# Altium integrated library WCAP-ATG5_rev15a.intlib: 201 symbols (part 2 of 3)
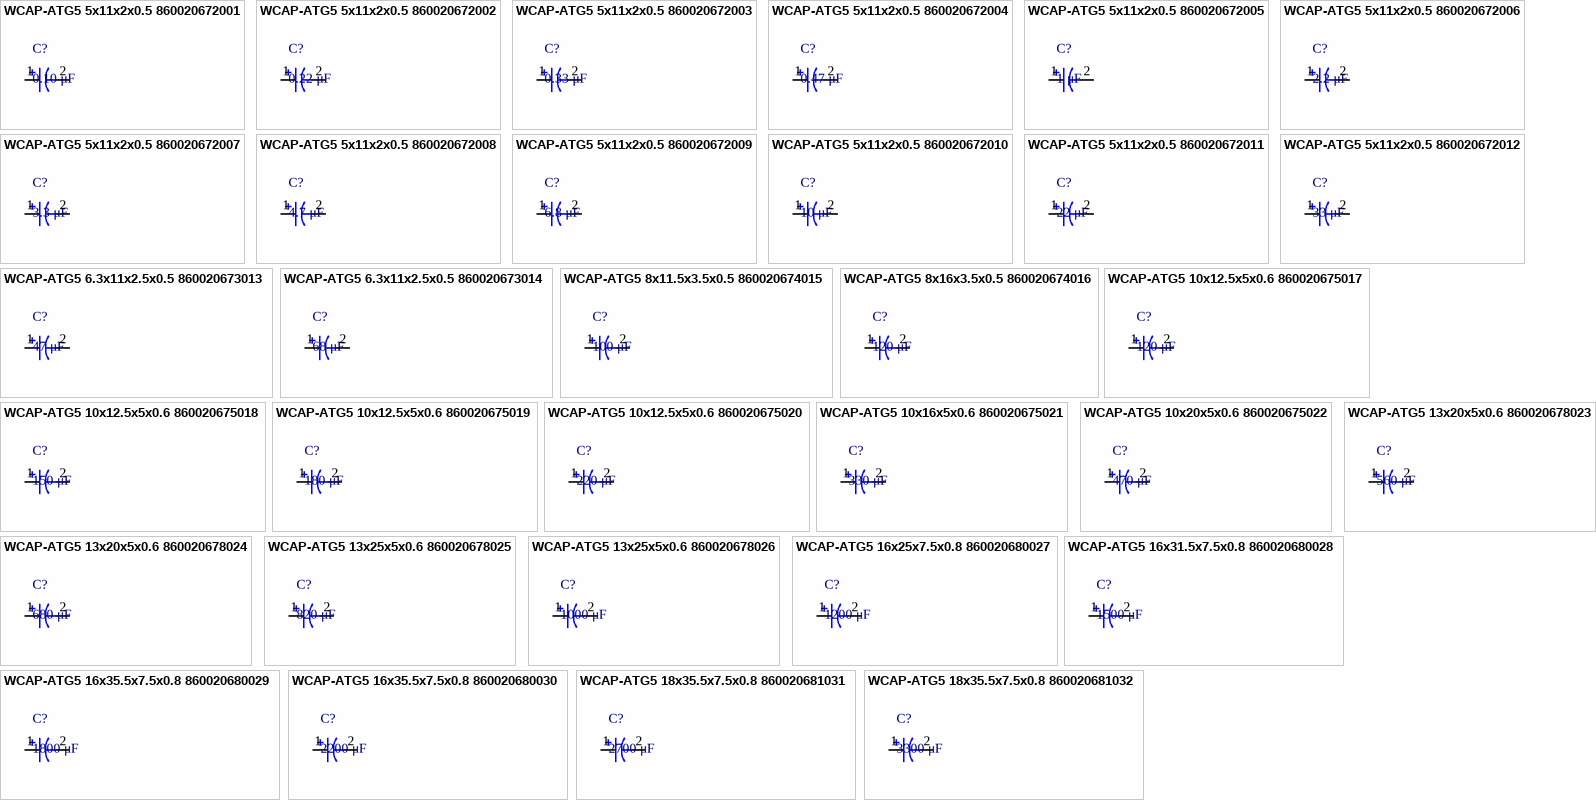
[diagram p7: symbols WCAP-ATG5 5x11x2x0.5 860020672001 to WCAP-ATG5 18x35.5x7.5x0.8 860020681032]

## WCAP-ATG5 5x11x2x0.5 860020672002
designator C?, comment 0.22 μF
WCAP-ATG5 Aluminum Electrolytic Capacitors , 0,22 μF; + / - 20%; 50 V , 5 x 11; Manufacturer: Wurth Elektronik; partNo: 860020672002; E-mail: libraries@we-online.com; Characteristics: Aluminum Electrolytic Capacitor; Recommended soldering: Wave; Operating temperature:–40 °C to +105 °C for UR < 400 V; –25 °C to +105 °C for UR ≥ 400 V; General purpose product series with max. temperature of +105 °C; Load life: 2000 h @ +105 °C; ComponentLink1Description: Manufacturer; ComponentLink1URL: http://www.we-online.com; ComponentLink2Description: Datasheet; ComponentLink2URL: http://katalog.we-online.de/pbs/datasheet/860020672002.pdf; Created by: Karrer Zheng; Created Date: 6/8/2015; Capacitance: 0.22 μF; Application: Medium and high voltage type range from 160V-450V used as primary side input filter in power supply; Low voltage type used as energy storage or low frequency filtering in circuit, applied to general switching power supply, AC-DC converter, adapter, charger, TV, VCR, DC motor circuit filter, digital audio, digital cameras, digital video cameras, satellite receiver etc.
footprint WCAP-ATG5 5x11x2x0.5
pins: 1, 2

## WCAP-ATG5 5x11x2x0.5 860020672003
designator C?, comment 0.33 μF
WCAP-ATG5 Aluminum Electrolytic Capacitors , 0,33 μF; + / - 20%; 50 V , 5 x 11; Manufacturer: Wurth Elektronik; partNo: 860020672003; E-mail: libraries@we-online.com; Characteristics: Aluminum Electrolytic Capacitor; Recommended soldering: Wave; Operating temperature:–40 °C to +105 °C for UR < 400 V; –25 °C to +105 °C for UR ≥ 400 V; General purpose product series with max. temperature of +105 °C; Load life: 2000 h @ +105 °C; ComponentLink1Description: Manufacturer; ComponentLink1URL: http://www.we-online.com; ComponentLink2Description: Datasheet; ComponentLink2URL: http://katalog.we-online.de/pbs/datasheet/860020672003.pdf; Created by: Karrer Zheng; Created Date: 6/8/2015; Capacitance: 0.33 μF; Application: Medium and high voltage type range from 160V-450V used as primary side input filter in power supply; Low voltage type used as energy storage or low frequency filtering in circuit, applied to general switching power supply, AC-DC converter, adapter, charger, TV, VCR, DC motor circuit filter, digital audio, digital cameras, digital video cameras, satellite receiver etc.
footprint WCAP-ATG5 5x11x2x0.5
pins: 1, 2

## WCAP-ATG5 5x11x2x0.5 860020672004
designator C?, comment 0.47 μF
WCAP-ATG5 Aluminum Electrolytic Capacitors , 0,47 μF; + / - 20%; 50 V , 5 x 11; Manufacturer: Wurth Elektronik; partNo: 860020672004; E-mail: libraries@we-online.com; Characteristics: Aluminum Electrolytic Capacitor; Recommended soldering: Wave; Operating temperature:–40 °C to +105 °C for UR < 400 V; –25 °C to +105 °C for UR ≥ 400 V; General purpose product series with max. temperature of +105 °C; Load life: 2000 h @ +105 °C; ComponentLink1Description: Manufacturer; ComponentLink1URL: http://www.we-online.com; ComponentLink2Description: Datasheet; ComponentLink2URL: http://katalog.we-online.de/pbs/datasheet/860020672004.pdf; Created by: Karrer Zheng; Created Date: 6/8/2015; Capacitance: 0.47 μF; Application: Medium and high voltage type range from 160V-450V used as primary side input filter in power supply; Low voltage type used as energy storage or low frequency filtering in circuit, applied to general switching power supply, AC-DC converter, adapter, charger, TV, VCR, DC motor circuit filter, digital audio, digital cameras, digital video cameras, satellite receiver etc.
footprint WCAP-ATG5 5x11x2x0.5
pins: 1, 2

## WCAP-ATG5 5x11x2x0.5 860020672005
designator C?, comment 1 μF
WCAP-ATG5 Aluminum Electrolytic Capacitors , 1 μF; + / - 20%; 50 V , 5 x 11; Manufacturer: Wurth Elektronik; partNo: 860020672005; E-mail: libraries@we-online.com; Characteristics: Aluminum Electrolytic Capacitor; Recommended soldering: Wave; Operating temperature:–40 °C to +105 °C for UR < 400 V; –25 °C to +105 °C for UR ≥ 400 V; General purpose product series with max. temperature of +105 °C; Load life: 2000 h @ +105 °C; ComponentLink1Description: Manufacturer; ComponentLink1URL: http://www.we-online.com; ComponentLink2Description: Datasheet; ComponentLink2URL: http://katalog.we-online.de/pbs/datasheet/860020672005.pdf; Created by: Karrer Zheng; Created Date: 6/8/2015; Capacitance: 1 μF; Application: Medium and high voltage type range from 160V-450V used as primary side input filter in power supply; Low voltage type used as energy storage or low frequency filtering in circuit, applied to general switching power supply, AC-DC converter, adapter, charger, TV, VCR, DC motor circuit filter, digital audio, digital cameras, digital video cameras, satellite receiver etc.
footprint WCAP-ATG5 5x11x2x0.5
pins: 1, 2

## WCAP-ATG5 5x11x2x0.5 860020672006
designator C?, comment 2.2 μF
WCAP-ATG5 Aluminum Electrolytic Capacitors , 2,2 μF; + / - 20%; 50 V , 5 x 11; Manufacturer: Wurth Elektronik; partNo: 860020672006; E-mail: libraries@we-online.com; Characteristics: Aluminum Electrolytic Capacitor; Recommended soldering: Wave; Operating temperature:–40 °C to +105 °C for UR < 400 V; –25 °C to +105 °C for UR ≥ 400 V; General purpose product series with max. temperature of +105 °C; Load life: 2000 h @ +105 °C; ComponentLink1Description: Manufacturer; ComponentLink1URL: http://www.we-online.com; ComponentLink2Description: Datasheet; ComponentLink2URL: http://katalog.we-online.de/pbs/datasheet/860020672006.pdf; Created by: Karrer Zheng; Created Date: 6/8/2015; Capacitance: 2.2 μF; Application: Medium and high voltage type range from 160V-450V used as primary side input filter in power supply; Low voltage type used as energy storage or low frequency filtering in circuit, applied to general switching power supply, AC-DC converter, adapter, charger, TV, VCR, DC motor circuit filter, digital audio, digital cameras, digital video cameras, satellite receiver etc.
footprint WCAP-ATG5 5x11x2x0.5
pins: 1, 2

## WCAP-ATG5 5x11x2x0.5 860020672007
designator C?, comment 3.3 μF
WCAP-ATG5 Aluminum Electrolytic Capacitors , 3,3 μF; + / - 20%; 50 V , 5 x 11; Manufacturer: Wurth Elektronik; partNo: 860020672007; E-mail: libraries@we-online.com; Characteristics: Aluminum Electrolytic Capacitor; Recommended soldering: Wave; Operating temperature:–40 °C to +105 °C for UR < 400 V; –25 °C to +105 °C for UR ≥ 400 V; General purpose product series with max. temperature of +105 °C; Load life: 2000 h @ +105 °C; ComponentLink1Description: Manufacturer; ComponentLink1URL: http://www.we-online.com; ComponentLink2Description: Datasheet; ComponentLink2URL: http://katalog.we-online.de/pbs/datasheet/860020672007.pdf; Created by: Karrer Zheng; Created Date: 6/8/2015; Capacitance: 3.3 μF; Application: Medium and high voltage type range from 160V-450V used as primary side input filter in power supply; Low voltage type used as energy storage or low frequency filtering in circuit, applied to general switching power supply, AC-DC converter, adapter, charger, TV, VCR, DC motor circuit filter, digital audio, digital cameras, digital video cameras, satellite receiver etc.
footprint WCAP-ATG5 5x11x2x0.5
pins: 1, 2

## WCAP-ATG5 5x11x2x0.5 860020672008
designator C?, comment 4.7 μF
WCAP-ATG5 Aluminum Electrolytic Capacitors , 4,7 μF; + / - 20%; 50 V , 5 x 11; Manufacturer: Wurth Elektronik; partNo: 860020672008; E-mail: libraries@we-online.com; Characteristics: Aluminum Electrolytic Capacitor; Recommended soldering: Wave; Operating temperature:–40 °C to +105 °C for UR < 400 V; –25 °C to +105 °C for UR ≥ 400 V; General purpose product series with max. temperature of +105 °C; Load life: 2000 h @ +105 °C; ComponentLink1Description: Manufacturer; ComponentLink1URL: http://www.we-online.com; ComponentLink2Description: Datasheet; ComponentLink2URL: http://katalog.we-online.de/pbs/datasheet/860020672008.pdf; Created by: Karrer Zheng; Created Date: 6/8/2015; Capacitance: 4.7 μF; Application: Medium and high voltage type range from 160V-450V used as primary side input filter in power supply; Low voltage type used as energy storage or low frequency filtering in circuit, applied to general switching power supply, AC-DC converter, adapter, charger, TV, VCR, DC motor circuit filter, digital audio, digital cameras, digital video cameras, satellite receiver etc.
footprint WCAP-ATG5 5x11x2x0.5
pins: 1, 2

## WCAP-ATG5 5x11x2x0.5 860020672009
designator C?, comment 6.8 μF
WCAP-ATG5 Aluminum Electrolytic Capacitors , 6,8 μF; + / - 20%; 50 V , 5 x 11; Manufacturer: Wurth Elektronik; partNo: 860020672009; E-mail: libraries@we-online.com; Characteristics: Aluminum Electrolytic Capacitor; Recommended soldering: Wave; Operating temperature:–40 °C to +105 °C for UR < 400 V; –25 °C to +105 °C for UR ≥ 400 V; General purpose product series with max. temperature of +105 °C; Load life: 2000 h @ +105 °C; ComponentLink1Description: Manufacturer; ComponentLink1URL: http://www.we-online.com; ComponentLink2Description: Datasheet; ComponentLink2URL: http://katalog.we-online.de/pbs/datasheet/860020672009.pdf; Created by: Karrer Zheng; Created Date: 6/8/2015; Capacitance: 6.8 μF; Application: Medium and high voltage type range from 160V-450V used as primary side input filter in power supply; Low voltage type used as energy storage or low frequency filtering in circuit, applied to general switching power supply, AC-DC converter, adapter, charger, TV, VCR, DC motor circuit filter, digital audio, digital cameras, digital video cameras, satellite receiver etc.
footprint WCAP-ATG5 5x11x2x0.5
pins: 1, 2

## WCAP-ATG5 5x11x2x0.5 860020672010
designator C?, comment 10 μF
WCAP-ATG5 Aluminum Electrolytic Capacitors , 10 μF; + / - 20%; 50 V , 5 x 11; Manufacturer: Wurth Elektronik; partNo: 860020672010; E-mail: libraries@we-online.com; Characteristics: Aluminum Electrolytic Capacitor; Recommended soldering: Wave; Operating temperature:–40 °C to +105 °C for UR < 400 V; –25 °C to +105 °C for UR ≥ 400 V; General purpose product series with max. temperature of +105 °C; Load life: 2000 h @ +105 °C; ComponentLink1Description: Manufacturer; ComponentLink1URL: http://www.we-online.com; ComponentLink2Description: Datasheet; ComponentLink2URL: http://katalog.we-online.de/pbs/datasheet/860020672010.pdf; Created by: Karrer Zheng; Created Date: 6/8/2015; Capacitance: 10 μF; Application: Medium and high voltage type range from 160V-450V used as primary side input filter in power supply; Low voltage type used as energy storage or low frequency filtering in circuit, applied to general switching power supply, AC-DC converter, adapter, charger, TV, VCR, DC motor circuit filter, digital audio, digital cameras, digital video cameras, satellite receiver etc.
footprint WCAP-ATG5 5x11x2x0.5
pins: 1, 2

## WCAP-ATG5 5x11x2x0.5 860020672011
designator C?, comment 22 μF
WCAP-ATG5 Aluminum Electrolytic Capacitors , 22 μF; + / - 20%; 50 V , 5 x 11; Manufacturer: Wurth Elektronik; partNo: 860020672011; E-mail: libraries@we-online.com; Characteristics: Aluminum Electrolytic Capacitor; Recommended soldering: Wave; Operating temperature:–40 °C to +105 °C for UR < 400 V; –25 °C to +105 °C for UR ≥ 400 V; General purpose product series with max. temperature of +105 °C; Load life: 2000 h @ +105 °C; ComponentLink1Description: Manufacturer; ComponentLink1URL: http://www.we-online.com; ComponentLink2Description: Datasheet; ComponentLink2URL: http://katalog.we-online.de/pbs/datasheet/860020672011.pdf; Created by: Karrer Zheng; Created Date: 6/8/2015; Capacitance: 22 μF; Application: Medium and high voltage type range from 160V-450V used as primary side input filter in power supply; Low voltage type used as energy storage or low frequency filtering in circuit, applied to general switching power supply, AC-DC converter, adapter, charger, TV, VCR, DC motor circuit filter, digital audio, digital cameras, digital video cameras, satellite receiver etc.
footprint WCAP-ATG5 5x11x2x0.5
pins: 1, 2

## WCAP-ATG5 5x11x2x0.5 860020672012
designator C?, comment 33 μF
WCAP-ATG5 Aluminum Electrolytic Capacitors , 33 μF; + / - 20%; 50 V , 5 x 11; Manufacturer: Wurth Elektronik; partNo: 860020672012; E-mail: libraries@we-online.com; Characteristics: Aluminum Electrolytic Capacitor; Recommended soldering: Wave; Operating temperature:–40 °C to +105 °C for UR < 400 V; –25 °C to +105 °C for UR ≥ 400 V; General purpose product series with max. temperature of +105 °C; Load life: 2000 h @ +105 °C; ComponentLink1Description: Manufacturer; ComponentLink1URL: http://www.we-online.com; ComponentLink2Description: Datasheet; ComponentLink2URL: http://katalog.we-online.de/pbs/datasheet/860020672012.pdf; Created by: Karrer Zheng; Created Date: 6/8/2015; Capacitance: 33 μF; Application: Medium and high voltage type range from 160V-450V used as primary side input filter in power supply; Low voltage type used as energy storage or low frequency filtering in circuit, applied to general switching power supply, AC-DC converter, adapter, charger, TV, VCR, DC motor circuit filter, digital audio, digital cameras, digital video cameras, satellite receiver etc.
footprint WCAP-ATG5 5x11x2x0.5
pins: 1, 2

## WCAP-ATG5 6.3x11x2.5x0.5 860020673013
designator C?, comment 47 μF
WCAP-ATG5 Aluminum Electrolytic Capacitors , 47 μF; + / - 20%; 50 V , 6,3 x 11; Manufacturer: Wurth Elektronik; partNo: 860020673013; E-mail: libraries@we-online.com; Characteristics: Aluminum Electrolytic Capacitor; Recommended soldering: Wave; Operating temperature:–40 °C to +105 °C for UR < 400 V; –25 °C to +105 °C for UR ≥ 400 V; General purpose product series with max. temperature of +105 °C; Load life: 2000 h @ +105 °C; ComponentLink1Description: Manufacturer; ComponentLink1URL: http://www.we-online.com; ComponentLink2Description: Datasheet; ComponentLink2URL: http://katalog.we-online.de/pbs/datasheet/860020673013.pdf; Created by: Karrer Zheng; Created Date: 6/8/2015; Capacitance: 47 μF; Application: Medium and high voltage type range from 160V-450V used as primary side input filter in power supply; Low voltage type used as energy storage or low frequency filtering in circuit, applied to general switching power supply, AC-DC converter, adapter, charger, TV, VCR, DC motor circuit filter, digital audio, digital cameras, digital video cameras, satellite receiver etc.
footprint WCAP-ATG5 6.3x11x2.5x0.5
pins: 1, 2

## WCAP-ATG5 6.3x11x2.5x0.5 860020673014
designator C?, comment 68 μF
WCAP-ATG5 Aluminum Electrolytic Capacitors , 68 μF; + / - 20%; 50 V , 6,3 x 11; Manufacturer: Wurth Elektronik; partNo: 860020673014; E-mail: libraries@we-online.com; Characteristics: Aluminum Electrolytic Capacitor; Recommended soldering: Wave; Operating temperature:–40 °C to +105 °C for UR < 400 V; –25 °C to +105 °C for UR ≥ 400 V; General purpose product series with max. temperature of +105 °C; Load life: 2000 h @ +105 °C; ComponentLink1Description: Manufacturer; ComponentLink1URL: http://www.we-online.com; ComponentLink2Description: Datasheet; ComponentLink2URL: http://katalog.we-online.de/pbs/datasheet/860020673014.pdf; Created by: Karrer Zheng; Created Date: 6/8/2015; Capacitance: 68 μF; Application: Medium and high voltage type range from 160V-450V used as primary side input filter in power supply; Low voltage type used as energy storage or low frequency filtering in circuit, applied to general switching power supply, AC-DC converter, adapter, charger, TV, VCR, DC motor circuit filter, digital audio, digital cameras, digital video cameras, satellite receiver etc.
footprint WCAP-ATG5 6.3x11x2.5x0.5
pins: 1, 2

## WCAP-ATG5 8x11.5x3.5x0.5 860020674015
designator C?, comment 100 μF
WCAP-ATG5 Aluminum Electrolytic Capacitors , 100 μF; + / - 20%; 50 V , 8 x 11,5; Manufacturer: Wurth Elektronik; partNo: 860020674015; E-mail: libraries@we-online.com; Characteristics: Aluminum Electrolytic Capacitor; Recommended soldering: Wave; Operating temperature:–40 °C to +105 °C for UR < 400 V; –25 °C to +105 °C for UR ≥ 400 V; General purpose product series with max. temperature of +105 °C; Load life: 2000 h @ +105 °C; ComponentLink1Description: Manufacturer; ComponentLink1URL: http://www.we-online.com; ComponentLink2Description: Datasheet; ComponentLink2URL: http://katalog.we-online.de/pbs/datasheet/860020674015.pdf; Created by: Karrer Zheng; Created Date: 6/8/2015; Capacitance: 100 μF; Application: Medium and high voltage type range from 160V-450V used as primary side input filter in power supply; Low voltage type used as energy storage or low frequency filtering in circuit, applied to general switching power supply, AC-DC converter, adapter, charger, TV, VCR, DC motor circuit filter, digital audio, digital cameras, digital video cameras, satellite receiver etc.
footprint WCAP-ATG5 8x11.5x3.5x0.5
pins: 1, 2

## WCAP-ATG5 8x16x3.5x0.5 860020674016
designator C?, comment 120 μF
WCAP-ATG5 Aluminum Electrolytic Capacitors , 120 μF; + / - 20%; 50 V , 8 x 16; Manufacturer: Wurth Elektronik; partNo: 860020674016; E-mail: libraries@we-online.com; Characteristics: Aluminum Electrolytic Capacitor; Recommended soldering: Wave; Operating temperature:–40 °C to +105 °C for UR < 400 V; –25 °C to +105 °C for UR ≥ 400 V; General purpose product series with max. temperature of +105 °C; Load life: 2000 h @ +105 °C; ComponentLink1Description: Manufacturer; ComponentLink1URL: http://www.we-online.com; ComponentLink2Description: Datasheet; ComponentLink2URL: http://katalog.we-online.de/pbs/datasheet/860020674016.pdf; Created by: Karrer Zheng; Created Date: 6/8/2015; Capacitance: 120 μF; Application: Medium and high voltage type range from 160V-450V used as primary side input filter in power supply; Low voltage type used as energy storage or low frequency filtering in circuit, applied to general switching power supply, AC-DC converter, adapter, charger, TV, VCR, DC motor circuit filter, digital audio, digital cameras, digital video cameras, satellite receiver etc.
footprint WCAP-ATG5 8x16x3.5x0.5
pins: 1, 2

## WCAP-ATG5 10x12.5x5x0.6 860020675017
designator C?, comment 120 μF
WCAP-ATG5 Aluminum Electrolytic Capacitors , 120 μF; + / - 20%; 50 V , 10 x 12,5; Manufacturer: Wurth Elektronik; partNo: 860020675017; E-mail: libraries@we-online.com; Characteristics: Aluminum Electrolytic Capacitor; Recommended soldering: Wave; Operating temperature:–40 °C to +105 °C for UR < 400 V; –25 °C to +105 °C for UR ≥ 400 V; General purpose product series with max. temperature of +105 °C; Load life: 2000 h @ +105 °C; ComponentLink1Description: Manufacturer; ComponentLink1URL: http://www.we-online.com; ComponentLink2Description: Datasheet; ComponentLink2URL: http://katalog.we-online.de/pbs/datasheet/860020675017.pdf; Created by: Karrer Zheng; Created Date: 6/8/2015; Capacitance: 120 μF; Application: Medium and high voltage type range from 160V-450V used as primary side input filter in power supply; Low voltage type used as energy storage or low frequency filtering in circuit, applied to general switching power supply, AC-DC converter, adapter, charger, TV, VCR, DC motor circuit filter, digital audio, digital cameras, digital video cameras, satellite receiver etc.
footprint WCAP-ATG5 10x12.5x5x0.6
pins: 1, 2

## WCAP-ATG5 10x12.5x5x0.6 860020675018
designator C?, comment 150 μF
WCAP-ATG5 Aluminum Electrolytic Capacitors , 150 μF; + / - 20%; 50 V , 10 x 12,5; Manufacturer: Wurth Elektronik; partNo: 860020675018; E-mail: libraries@we-online.com; Characteristics: Aluminum Electrolytic Capacitor; Recommended soldering: Wave; Operating temperature:–40 °C to +105 °C for UR < 400 V; –25 °C to +105 °C for UR ≥ 400 V; General purpose product series with max. temperature of +105 °C; Load life: 2000 h @ +105 °C; ComponentLink1Description: Manufacturer; ComponentLink1URL: http://www.we-online.com; ComponentLink2Description: Datasheet; ComponentLink2URL: http://katalog.we-online.de/pbs/datasheet/860020675018.pdf; Created by: Karrer Zheng; Created Date: 6/8/2015; Capacitance: 150 μF; Application: Medium and high voltage type range from 160V-450V used as primary side input filter in power supply; Low voltage type used as energy storage or low frequency filtering in circuit, applied to general switching power supply, AC-DC converter, adapter, charger, TV, VCR, DC motor circuit filter, digital audio, digital cameras, digital video cameras, satellite receiver etc.
footprint WCAP-ATG5 10x12.5x5x0.6
pins: 1, 2

## WCAP-ATG5 10x12.5x5x0.6 860020675019
designator C?, comment 180 μF
WCAP-ATG5 Aluminum Electrolytic Capacitors , 180 μF; + / - 20%; 50 V , 10 x 12,5; Manufacturer: Wurth Elektronik; partNo: 860020675019; E-mail: libraries@we-online.com; Characteristics: Aluminum Electrolytic Capacitor; Recommended soldering: Wave; Operating temperature:–40 °C to +105 °C for UR < 400 V; –25 °C to +105 °C for UR ≥ 400 V; General purpose product series with max. temperature of +105 °C; Load life: 2000 h @ +105 °C; ComponentLink1Description: Manufacturer; ComponentLink1URL: http://www.we-online.com; ComponentLink2Description: Datasheet; ComponentLink2URL: http://katalog.we-online.de/pbs/datasheet/860020675019.pdf; Created by: Karrer Zheng; Created Date: 6/8/2015; Capacitance: 180 μF; Application: Medium and high voltage type range from 160V-450V used as primary side input filter in power supply; Low voltage type used as energy storage or low frequency filtering in circuit, applied to general switching power supply, AC-DC converter, adapter, charger, TV, VCR, DC motor circuit filter, digital audio, digital cameras, digital video cameras, satellite receiver etc.
footprint WCAP-ATG5 10x12.5x5x0.6
pins: 1, 2

## WCAP-ATG5 10x12.5x5x0.6 860020675020
designator C?, comment 220 μF
WCAP-ATG5 Aluminum Electrolytic Capacitors , 220 μF; + / - 20%; 50 V , 10 x 12,5; Manufacturer: Wurth Elektronik; partNo: 860020675020; E-mail: libraries@we-online.com; Characteristics: Aluminum Electrolytic Capacitor; Recommended soldering: Wave; Operating temperature:–40 °C to +105 °C for UR < 400 V; –25 °C to +105 °C for UR ≥ 400 V; General purpose product series with max. temperature of +105 °C; Load life: 2000 h @ +105 °C; ComponentLink1Description: Manufacturer; ComponentLink1URL: http://www.we-online.com; ComponentLink2Description: Datasheet; ComponentLink2URL: http://katalog.we-online.de/pbs/datasheet/860020675020.pdf; Created by: Karrer Zheng; Created Date: 6/8/2015; Capacitance: 220 μF; Application: Medium and high voltage type range from 160V-450V used as primary side input filter in power supply; Low voltage type used as energy storage or low frequency filtering in circuit, applied to general switching power supply, AC-DC converter, adapter, charger, TV, VCR, DC motor circuit filter, digital audio, digital cameras, digital video cameras, satellite receiver etc.
footprint WCAP-ATG5 10x12.5x5x0.6
pins: 1, 2

## WCAP-ATG5 10x16x5x0.6 860020675021
designator C?, comment 330 μF
WCAP-ATG5 Aluminum Electrolytic Capacitors , 330 μF; + / - 20%; 50 V , 10 x 16; Manufacturer: Wurth Elektronik; partNo: 860020675021; E-mail: libraries@we-online.com; Characteristics: Aluminum Electrolytic Capacitor; Recommended soldering: Wave; Operating temperature:–40 °C to +105 °C for UR < 400 V; –25 °C to +105 °C for UR ≥ 400 V; General purpose product series with max. temperature of +105 °C; Load life: 2000 h @ +105 °C; ComponentLink1Description: Manufacturer; ComponentLink1URL: http://www.we-online.com; ComponentLink2Description: Datasheet; ComponentLink2URL: http://katalog.we-online.de/pbs/datasheet/860020675021.pdf; Created by: Karrer Zheng; Created Date: 6/8/2015; Capacitance: 330 μF; Application: Medium and high voltage type range from 160V-450V used as primary side input filter in power supply; Low voltage type used as energy storage or low frequency filtering in circuit, applied to general switching power supply, AC-DC converter, adapter, charger, TV, VCR, DC motor circuit filter, digital audio, digital cameras, digital video cameras, satellite receiver etc.
footprint WCAP-ATG5 10x16x5x0.6
pins: 1, 2

## WCAP-ATG5 10x20x5x0.6 860020675022
designator C?, comment 470 μF
WCAP-ATG5 Aluminum Electrolytic Capacitors , 470 μF; + / - 20%; 50 V , 10 x 20; Manufacturer: Wurth Elektronik; partNo: 860020675022; E-mail: libraries@we-online.com; Characteristics: Aluminum Electrolytic Capacitor; Recommended soldering: Wave; Operating temperature:–40 °C to +105 °C for UR < 400 V; –25 °C to +105 °C for UR ≥ 400 V; General purpose product series with max. temperature of +105 °C; Load life: 2000 h @ +105 °C; ComponentLink1Description: Manufacturer; ComponentLink1URL: http://www.we-online.com; ComponentLink2Description: Datasheet; ComponentLink2URL: http://katalog.we-online.de/pbs/datasheet/860020675022.pdf; Created by: Karrer Zheng; Created Date: 6/8/2015; Capacitance: 470 μF; Application: Medium and high voltage type range from 160V-450V used as primary side input filter in power supply; Low voltage type used as energy storage or low frequency filtering in circuit, applied to general switching power supply, AC-DC converter, adapter, charger, TV, VCR, DC motor circuit filter, digital audio, digital cameras, digital video cameras, satellite receiver etc.
footprint WCAP-ATG5 10x20x5x0.6
pins: 1, 2

## WCAP-ATG5 13x20x5x0.6 860020678023
designator C?, comment 560 μF
WCAP-ATG5 Aluminum Electrolytic Capacitors , 560 μF; + / - 20%; 50 V , 13 x 20; Manufacturer: Wurth Elektronik; partNo: 860020678023; E-mail: libraries@we-online.com; Characteristics: Aluminum Electrolytic Capacitor; Recommended soldering: Wave; Operating temperature:–40 °C to +105 °C for UR < 400 V; –25 °C to +105 °C for UR ≥ 400 V; General purpose product series with max. temperature of +105 °C; Load life: 2000 h @ +105 °C; ComponentLink1Description: Manufacturer; ComponentLink1URL: http://www.we-online.com; ComponentLink2Description: Datasheet; ComponentLink2URL: http://katalog.we-online.de/pbs/datasheet/860020678023.pdf; Created by: Karrer Zheng; Created Date: 6/8/2015; Capacitance: 560 μF; Application: Medium and high voltage type range from 160V-450V used as primary side input filter in power supply; Low voltage type used as energy storage or low frequency filtering in circuit, applied to general switching power supply, AC-DC converter, adapter, charger, TV, VCR, DC motor circuit filter, digital audio, digital cameras, digital video cameras, satellite receiver etc.
footprint WCAP-ATG5 13x20x5x0.6
pins: 1, 2

## WCAP-ATG5 13x20x5x0.6 860020678024
designator C?, comment 680 μF
WCAP-ATG5 Aluminum Electrolytic Capacitors , 680 μF; + / - 20%; 50 V , 13 x 20; Manufacturer: Wurth Elektronik; partNo: 860020678024; E-mail: libraries@we-online.com; Characteristics: Aluminum Electrolytic Capacitor; Recommended soldering: Wave; Operating temperature:–40 °C to +105 °C for UR < 400 V; –25 °C to +105 °C for UR ≥ 400 V; General purpose product series with max. temperature of +105 °C; Load life: 2000 h @ +105 °C; ComponentLink1Description: Manufacturer; ComponentLink1URL: http://www.we-online.com; ComponentLink2Description: Datasheet; ComponentLink2URL: http://katalog.we-online.de/pbs/datasheet/860020678024.pdf; Created by: Karrer Zheng; Created Date: 6/8/2015; Capacitance: 680 μF; Application: Medium and high voltage type range from 160V-450V used as primary side input filter in power supply; Low voltage type used as energy storage or low frequency filtering in circuit, applied to general switching power supply, AC-DC converter, adapter, charger, TV, VCR, DC motor circuit filter, digital audio, digital cameras, digital video cameras, satellite receiver etc.
footprint WCAP-ATG5 13x20x5x0.6
pins: 1, 2

## WCAP-ATG5 13x25x5x0.6 860020678025
designator C?, comment 820 μF
WCAP-ATG5 Aluminum Electrolytic Capacitors , 820 μF; + / - 20%; 50 V , 13 x 25; Manufacturer: Wurth Elektronik; partNo: 860020678025; E-mail: libraries@we-online.com; Characteristics: Aluminum Electrolytic Capacitor; Recommended soldering: Wave; Operating temperature:–40 °C to +105 °C for UR < 400 V; –25 °C to +105 °C for UR ≥ 400 V; General purpose product series with max. temperature of +105 °C; Load life: 2000 h @ +105 °C; ComponentLink1Description: Manufacturer; ComponentLink1URL: http://www.we-online.com; ComponentLink2Description: Datasheet; ComponentLink2URL: http://katalog.we-online.de/pbs/datasheet/860020678025.pdf; Created by: Karrer Zheng; Created Date: 6/8/2015; Capacitance: 820 μF; Application: Medium and high voltage type range from 160V-450V used as primary side input filter in power supply; Low voltage type used as energy storage or low frequency filtering in circuit, applied to general switching power supply, AC-DC converter, adapter, charger, TV, VCR, DC motor circuit filter, digital audio, digital cameras, digital video cameras, satellite receiver etc.
footprint WCAP-ATG5 13x25x5x0.6
pins: 1, 2

## WCAP-ATG5 13x25x5x0.6 860020678026
designator C?, comment 1000 μF
WCAP-ATG5 Aluminum Electrolytic Capacitors , 1000 μF; + / - 20%; 50 V , 13 x 25; Manufacturer: Wurth Elektronik; partNo: 860020678026; E-mail: libraries@we-online.com; Characteristics: Aluminum Electrolytic Capacitor; Recommended soldering: Wave; Operating temperature:–40 °C to +105 °C for UR < 400 V; –25 °C to +105 °C for UR ≥ 400 V; General purpose product series with max. temperature of +105 °C; Load life: 2000 h @ +105 °C; ComponentLink1Description: Manufacturer; ComponentLink1URL: http://www.we-online.com; ComponentLink2Description: Datasheet; ComponentLink2URL: http://katalog.we-online.de/pbs/datasheet/860020678026.pdf; Created by: Karrer Zheng; Created Date: 6/8/2015; Capacitance: 1000 μF; Application: Medium and high voltage type range from 160V-450V used as primary side input filter in power supply; Low voltage type used as energy storage or low frequency filtering in circuit, applied to general switching power supply, AC-DC converter, adapter, charger, TV, VCR, DC motor circuit filter, digital audio, digital cameras, digital video cameras, satellite receiver etc.
footprint WCAP-ATG5 13x25x5x0.6
pins: 1, 2

## WCAP-ATG5 16x25x7.5x0.8 860020680027
designator C?, comment 1200 μF
WCAP-ATG5 Aluminum Electrolytic Capacitors , 1200 μF; + / - 20%; 50 V , 16 x 25; Manufacturer: Wurth Elektronik; partNo: 860020680027; E-mail: libraries@we-online.com; Characteristics: Aluminum Electrolytic Capacitor; Recommended soldering: Wave; Operating temperature:–40 °C to +105 °C for UR < 400 V; –25 °C to +105 °C for UR ≥ 400 V; General purpose product series with max. temperature of +105 °C; Load life: 2000 h @ +105 °C; ComponentLink1Description: Manufacturer; ComponentLink1URL: http://www.we-online.com; ComponentLink2Description: Datasheet; ComponentLink2URL: http://katalog.we-online.de/pbs/datasheet/860020680027.pdf; Created by: Karrer Zheng; Created Date: 6/8/2015; Capacitance: 1200 μF; Application: Medium and high voltage type range from 160V-450V used as primary side input filter in power supply; Low voltage type used as energy storage or low frequency filtering in circuit, applied to general switching power supply, AC-DC converter, adapter, charger, TV, VCR, DC motor circuit filter, digital audio, digital cameras, digital video cameras, satellite receiver etc.
footprint WCAP-ATG5 16x25x7.5x0.8
pins: 1, 2

## WCAP-ATG5 16x31.5x7.5x0.8 860020680028
designator C?, comment 1500 μF
WCAP-ATG5 Aluminum Electrolytic Capacitors , 1500 μF; + / - 20%; 50 V , 16 x 31,5; Manufacturer: Wurth Elektronik; partNo: 860020680028; E-mail: libraries@we-online.com; Characteristics: Aluminum Electrolytic Capacitor; Recommended soldering: Wave; Operating temperature:–40 °C to +105 °C for UR < 400 V; –25 °C to +105 °C for UR ≥ 400 V; General purpose product series with max. temperature of +105 °C; Load life: 2000 h @ +105 °C; ComponentLink1Description: Manufacturer; ComponentLink1URL: http://www.we-online.com; ComponentLink2Description: Datasheet; ComponentLink2URL: http://katalog.we-online.de/pbs/datasheet/860020680028.pdf; Created by: Karrer Zheng; Created Date: 6/8/2015; Capacitance: 1500 μF; Application: Medium and high voltage type range from 160V-450V used as primary side input filter in power supply; Low voltage type used as energy storage or low frequency filtering in circuit, applied to general switching power supply, AC-DC converter, adapter, charger, TV, VCR, DC motor circuit filter, digital audio, digital cameras, digital video cameras, satellite receiver etc.
footprint WCAP-ATG5 16x31.5x7.5x0.8
pins: 1, 2

## WCAP-ATG5 16x35.5x7.5x0.8 860020680029
designator C?, comment 1800 μF
WCAP-ATG5 Aluminum Electrolytic Capacitors , 1800 μF; + / - 20%; 50 V , 16 x 35,5; Manufacturer: Wurth Elektronik; partNo: 860020680029; E-mail: libraries@we-online.com; Characteristics: Aluminum Electrolytic Capacitor; Recommended soldering: Wave; Operating temperature:–40 °C to +105 °C for UR < 400 V; –25 °C to +105 °C for UR ≥ 400 V; General purpose product series with max. temperature of +105 °C; Load life: 2000 h @ +105 °C; ComponentLink1Description: Manufacturer; ComponentLink1URL: http://www.we-online.com; ComponentLink2Description: Datasheet; ComponentLink2URL: http://katalog.we-online.de/pbs/datasheet/860020680029.pdf; Created by: Karrer Zheng; Created Date: 6/8/2015; Capacitance: 1800 μF; Application: Medium and high voltage type range from 160V-450V used as primary side input filter in power supply; Low voltage type used as energy storage or low frequency filtering in circuit, applied to general switching power supply, AC-DC converter, adapter, charger, TV, VCR, DC motor circuit filter, digital audio, digital cameras, digital video cameras, satellite receiver etc.
footprint WCAP-ATG5 16x35.5x7.5x0.8
pins: 1, 2

## WCAP-ATG5 16x35.5x7.5x0.8 860020680030
designator C?, comment 2200 μF
WCAP-ATG5 Aluminum Electrolytic Capacitors , 2200 μF; + / - 20%; 50 V , 16 x 35,5; Manufacturer: Wurth Elektronik; partNo: 860020680030; E-mail: libraries@we-online.com; Characteristics: Aluminum Electrolytic Capacitor; Recommended soldering: Wave; Operating temperature:–40 °C to +105 °C for UR < 400 V; –25 °C to +105 °C for UR ≥ 400 V; General purpose product series with max. temperature of +105 °C; Load life: 2000 h @ +105 °C; ComponentLink1Description: Manufacturer; ComponentLink1URL: http://www.we-online.com; ComponentLink2Description: Datasheet; ComponentLink2URL: http://katalog.we-online.de/pbs/datasheet/860020680030.pdf; Created by: Karrer Zheng; Created Date: 6/8/2015; Capacitance: 2200 μF; Application: Medium and high voltage type range from 160V-450V used as primary side input filter in power supply; Low voltage type used as energy storage or low frequency filtering in circuit, applied to general switching power supply, AC-DC converter, adapter, charger, TV, VCR, DC motor circuit filter, digital audio, digital cameras, digital video cameras, satellite receiver etc.
footprint WCAP-ATG5 16x35.5x7.5x0.8
pins: 1, 2

## WCAP-ATG5 18x35.5x7.5x0.8 860020681031
designator C?, comment 2700 μF
WCAP-ATG5 Aluminum Electrolytic Capacitors , 2700 μF; + / - 20%; 50 V , 18 x 35,5; Manufacturer: Wurth Elektronik; partNo: 860020681031; E-mail: libraries@we-online.com; Characteristics: Aluminum Electrolytic Capacitor; Recommended soldering: Wave; Operating temperature:–40 °C to +105 °C for UR < 400 V; –25 °C to +105 °C for UR ≥ 400 V; General purpose product series with max. temperature of +105 °C; Load life: 2000 h @ +105 °C; ComponentLink1Description: Manufacturer; ComponentLink1URL: http://www.we-online.com; ComponentLink2Description: Datasheet; ComponentLink2URL: http://katalog.we-online.de/pbs/datasheet/860020681031.pdf; Created by: Karrer Zheng; Created Date: 6/8/2015; Capacitance: 2700 μF; Application: Medium and high voltage type range from 160V-450V used as primary side input filter in power supply; Low voltage type used as energy storage or low frequency filtering in circuit, applied to general switching power supply, AC-DC converter, adapter, charger, TV, VCR, DC motor circuit filter, digital audio, digital cameras, digital video cameras, satellite receiver etc.
footprint WCAP-ATG5 18x35.5x7.5x0.8
pins: 1, 2

## WCAP-ATG5 18x35.5x7.5x0.8 860020681032
designator C?, comment 3300 μF
WCAP-ATG5 Aluminum Electrolytic Capacitors , 3300 μF; + / - 20%; 50 V , 18 x 35,5; Manufacturer: Wurth Elektronik; partNo: 860020681032; E-mail: libraries@we-online.com; Characteristics: Aluminum Electrolytic Capacitor; Recommended soldering: Wave; Operating temperature:–40 °C to +105 °C for UR < 400 V; –25 °C to +105 °C for UR ≥ 400 V; General purpose product series with max. temperature of +105 °C; Load life: 2000 h @ +105 °C; ComponentLink1Description: Manufacturer; ComponentLink1URL: http://www.we-online.com; ComponentLink2Description: Datasheet; ComponentLink2URL: http://katalog.we-online.de/pbs/datasheet/860020681032.pdf; Created by: Karrer Zheng; Created Date: 6/8/2015; Capacitance: 3300 μF; Application: Medium and high voltage type range from 160V-450V used as primary side input filter in power supply; Low voltage type used as energy storage or low frequency filtering in circuit, applied to general switching power supply, AC-DC converter, adapter, charger, TV, VCR, DC motor circuit filter, digital audio, digital cameras, digital video cameras, satellite receiver etc.
footprint WCAP-ATG5 18x35.5x7.5x0.8
pins: 1, 2


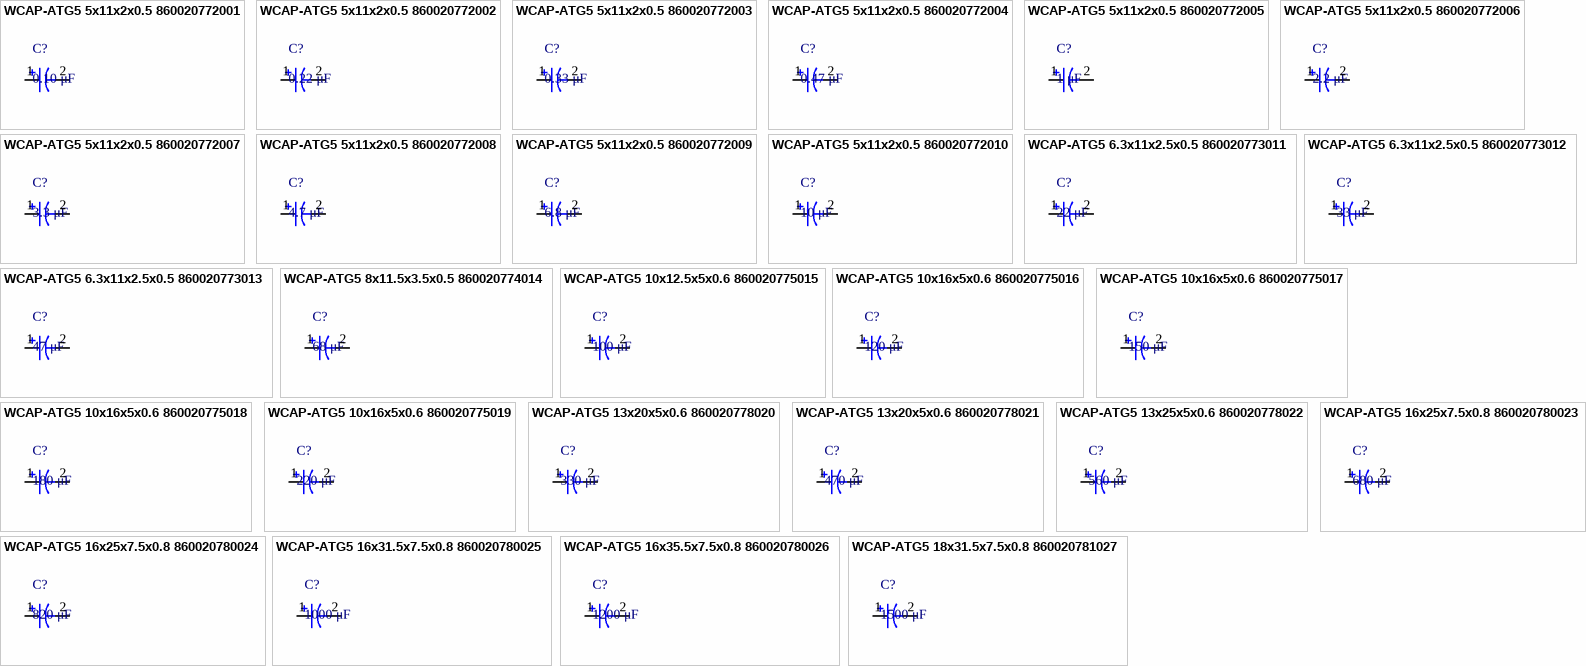
[diagram p4: symbols WCAP-ATG5 5x11x2x0.5 860020772001 to WCAP-ATG5 18x31.5x7.5x0.8 860020781027]

## WCAP-ATG5 5x11x2x0.5 860020772001
designator C?, comment 0.10 μF
WCAP-ATG5 Aluminum Electrolytic Capacitors , 0,10 μF; + / - 20%; 63 V , 5 x 11; Manufacturer: Wurth Elektronik; partNo: 860020772001; E-mail: libraries@we-online.com; Characteristics: Aluminum Electrolytic Capacitor; Recommended soldering: Wave; Operating temperature:–40 °C to +105 °C for UR < 400 V; –25 °C to +105 °C for UR ≥ 400 V; General purpose product series with max. temperature of +105 °C; Load life: 2000 h @ +105 °C; ComponentLink1Description: Manufacturer; ComponentLink1URL: http://www.we-online.com; ComponentLink2Description: Datasheet; ComponentLink2URL: http://katalog.we-online.de/pbs/datasheet/860020772001.pdf; Created by: Karrer Zheng; Created Date: 6/8/2015; Capacitance: 0.10 μF; Application: Medium and high voltage type range from 160V-450V used as primary side input filter in power supply; Low voltage type used as energy storage or low frequency filtering in circuit, applied to general switching power supply, AC-DC converter, adapter, charger, TV, VCR, DC motor circuit filter, digital audio, digital cameras, digital video cameras, satellite receiver etc.
footprint WCAP-ATG5 5x11x2x0.5
pins: 1, 2

## WCAP-ATG5 5x11x2x0.5 860020772002
designator C?, comment 0.22 μF
WCAP-ATG5 Aluminum Electrolytic Capacitors , 0,22 μF; + / - 20%; 63 V , 5 x 11; Manufacturer: Wurth Elektronik; partNo: 860020772002; E-mail: libraries@we-online.com; Characteristics: Aluminum Electrolytic Capacitor; Recommended soldering: Wave; Operating temperature:–40 °C to +105 °C for UR < 400 V; –25 °C to +105 °C for UR ≥ 400 V; General purpose product series with max. temperature of +105 °C; Load life: 2000 h @ +105 °C; ComponentLink1Description: Manufacturer; ComponentLink1URL: http://www.we-online.com; ComponentLink2Description: Datasheet; ComponentLink2URL: http://katalog.we-online.de/pbs/datasheet/860020772002.pdf; Created by: Karrer Zheng; Created Date: 6/8/2015; Capacitance: 0.22 μF; Application: Medium and high voltage type range from 160V-450V used as primary side input filter in power supply; Low voltage type used as energy storage or low frequency filtering in circuit, applied to general switching power supply, AC-DC converter, adapter, charger, TV, VCR, DC motor circuit filter, digital audio, digital cameras, digital video cameras, satellite receiver etc.
footprint WCAP-ATG5 5x11x2x0.5
pins: 1, 2

## WCAP-ATG5 5x11x2x0.5 860020772003
designator C?, comment 0.33 μF
WCAP-ATG5 Aluminum Electrolytic Capacitors , 0,33 μF; + / - 20%; 63 V , 5 x 11; Manufacturer: Wurth Elektronik; partNo: 860020772003; E-mail: libraries@we-online.com; Characteristics: Aluminum Electrolytic Capacitor; Recommended soldering: Wave; Operating temperature:–40 °C to +105 °C for UR < 400 V; –25 °C to +105 °C for UR ≥ 400 V; General purpose product series with max. temperature of +105 °C; Load life: 2000 h @ +105 °C; ComponentLink1Description: Manufacturer; ComponentLink1URL: http://www.we-online.com; ComponentLink2Description: Datasheet; ComponentLink2URL: http://katalog.we-online.de/pbs/datasheet/860020772003.pdf; Created by: Karrer Zheng; Created Date: 6/8/2015; Capacitance: 0.33 μF; Application: Medium and high voltage type range from 160V-450V used as primary side input filter in power supply; Low voltage type used as energy storage or low frequency filtering in circuit, applied to general switching power supply, AC-DC converter, adapter, charger, TV, VCR, DC motor circuit filter, digital audio, digital cameras, digital video cameras, satellite receiver etc.
footprint WCAP-ATG5 5x11x2x0.5
pins: 1, 2

## WCAP-ATG5 5x11x2x0.5 860020772004
designator C?, comment 0.47 μF
WCAP-ATG5 Aluminum Electrolytic Capacitors , 0,47 μF; + / - 20%; 63 V , 5 x 11; Manufacturer: Wurth Elektronik; partNo: 860020772004; E-mail: libraries@we-online.com; Characteristics: Aluminum Electrolytic Capacitor; Recommended soldering: Wave; Operating temperature:–40 °C to +105 °C for UR < 400 V; –25 °C to +105 °C for UR ≥ 400 V; General purpose product series with max. temperature of +105 °C; Load life: 2000 h @ +105 °C; ComponentLink1Description: Manufacturer; ComponentLink1URL: http://www.we-online.com; ComponentLink2Description: Datasheet; ComponentLink2URL: http://katalog.we-online.de/pbs/datasheet/860020772004.pdf; Created by: Karrer Zheng; Created Date: 6/8/2015; Capacitance: 0.47 μF; Application: Medium and high voltage type range from 160V-450V used as primary side input filter in power supply; Low voltage type used as energy storage or low frequency filtering in circuit, applied to general switching power supply, AC-DC converter, adapter, charger, TV, VCR, DC motor circuit filter, digital audio, digital cameras, digital video cameras, satellite receiver etc.
footprint WCAP-ATG5 5x11x2x0.5
pins: 1, 2

## WCAP-ATG5 5x11x2x0.5 860020772005
designator C?, comment 1 μF
WCAP-ATG5 Aluminum Electrolytic Capacitors , 1 μF; + / - 20%; 63 V , 5 x 11; Manufacturer: Wurth Elektronik; partNo: 860020772005; E-mail: libraries@we-online.com; Characteristics: Aluminum Electrolytic Capacitor; Recommended soldering: Wave; Operating temperature:–40 °C to +105 °C for UR < 400 V; –25 °C to +105 °C for UR ≥ 400 V; General purpose product series with max. temperature of +105 °C; Load life: 2000 h @ +105 °C; ComponentLink1Description: Manufacturer; ComponentLink1URL: http://www.we-online.com; ComponentLink2Description: Datasheet; ComponentLink2URL: http://katalog.we-online.de/pbs/datasheet/860020772005.pdf; Created by: Karrer Zheng; Created Date: 6/8/2015; Capacitance: 1 μF; Application: Medium and high voltage type range from 160V-450V used as primary side input filter in power supply; Low voltage type used as energy storage or low frequency filtering in circuit, applied to general switching power supply, AC-DC converter, adapter, charger, TV, VCR, DC motor circuit filter, digital audio, digital cameras, digital video cameras, satellite receiver etc.
footprint WCAP-ATG5 5x11x2x0.5
pins: 1, 2

## WCAP-ATG5 5x11x2x0.5 860020772006
designator C?, comment 2.2 μF
WCAP-ATG5 Aluminum Electrolytic Capacitors , 2,2 μF; + / - 20%; 63 V , 5 x 11; Manufacturer: Wurth Elektronik; partNo: 860020772006; E-mail: libraries@we-online.com; Characteristics: Aluminum Electrolytic Capacitor; Recommended soldering: Wave; Operating temperature:–40 °C to +105 °C for UR < 400 V; –25 °C to +105 °C for UR ≥ 400 V; General purpose product series with max. temperature of +105 °C; Load life: 2000 h @ +105 °C; ComponentLink1Description: Manufacturer; ComponentLink1URL: http://www.we-online.com; ComponentLink2Description: Datasheet; ComponentLink2URL: http://katalog.we-online.de/pbs/datasheet/860020772006.pdf; Created by: Karrer Zheng; Created Date: 6/8/2015; Capacitance: 2.2 μF; Application: Medium and high voltage type range from 160V-450V used as primary side input filter in power supply; Low voltage type used as energy storage or low frequency filtering in circuit, applied to general switching power supply, AC-DC converter, adapter, charger, TV, VCR, DC motor circuit filter, digital audio, digital cameras, digital video cameras, satellite receiver etc.
footprint WCAP-ATG5 5x11x2x0.5
pins: 1, 2

## WCAP-ATG5 5x11x2x0.5 860020772007
designator C?, comment 3.3 μF
WCAP-ATG5 Aluminum Electrolytic Capacitors , 3,3 μF; + / - 20%; 63 V , 5 x 11; Manufacturer: Wurth Elektronik; partNo: 860020772007; E-mail: libraries@we-online.com; Characteristics: Aluminum Electrolytic Capacitor; Recommended soldering: Wave; Operating temperature:–40 °C to +105 °C for UR < 400 V; –25 °C to +105 °C for UR ≥ 400 V; General purpose product series with max. temperature of +105 °C; Load life: 2000 h @ +105 °C; ComponentLink1Description: Manufacturer; ComponentLink1URL: http://www.we-online.com; ComponentLink2Description: Datasheet; ComponentLink2URL: http://katalog.we-online.de/pbs/datasheet/860020772007.pdf; Created by: Karrer Zheng; Created Date: 6/8/2015; Capacitance: 3.3 μF; Application: Medium and high voltage type range from 160V-450V used as primary side input filter in power supply; Low voltage type used as energy storage or low frequency filtering in circuit, applied to general switching power supply, AC-DC converter, adapter, charger, TV, VCR, DC motor circuit filter, digital audio, digital cameras, digital video cameras, satellite receiver etc.
footprint WCAP-ATG5 5x11x2x0.5
pins: 1, 2

## WCAP-ATG5 5x11x2x0.5 860020772008
designator C?, comment 4.7 μF
WCAP-ATG5 Aluminum Electrolytic Capacitors , 4,7 μF; + / - 20%; 63 V , 5 x 11; Manufacturer: Wurth Elektronik; partNo: 860020772008; E-mail: libraries@we-online.com; Characteristics: Aluminum Electrolytic Capacitor; Recommended soldering: Wave; Operating temperature:–40 °C to +105 °C for UR < 400 V; –25 °C to +105 °C for UR ≥ 400 V; General purpose product series with max. temperature of +105 °C; Load life: 2000 h @ +105 °C; ComponentLink1Description: Manufacturer; ComponentLink1URL: http://www.we-online.com; ComponentLink2Description: Datasheet; ComponentLink2URL: http://katalog.we-online.de/pbs/datasheet/860020772008.pdf; Created by: Karrer Zheng; Created Date: 6/8/2015; Capacitance: 4.7 μF; Application: Medium and high voltage type range from 160V-450V used as primary side input filter in power supply; Low voltage type used as energy storage or low frequency filtering in circuit, applied to general switching power supply, AC-DC converter, adapter, charger, TV, VCR, DC motor circuit filter, digital audio, digital cameras, digital video cameras, satellite receiver etc.
footprint WCAP-ATG5 5x11x2x0.5
pins: 1, 2

## WCAP-ATG5 5x11x2x0.5 860020772009
designator C?, comment 6.8 μF
WCAP-ATG5 Aluminum Electrolytic Capacitors , 6,8 μF; + / - 20%; 63 V , 5 x 11; Manufacturer: Wurth Elektronik; partNo: 860020772009; E-mail: libraries@we-online.com; Characteristics: Aluminum Electrolytic Capacitor; Recommended soldering: Wave; Operating temperature:–40 °C to +105 °C for UR < 400 V; –25 °C to +105 °C for UR ≥ 400 V; General purpose product series with max. temperature of +105 °C; Load life: 2000 h @ +105 °C; ComponentLink1Description: Manufacturer; ComponentLink1URL: http://www.we-online.com; ComponentLink2Description: Datasheet; ComponentLink2URL: http://katalog.we-online.de/pbs/datasheet/860020772009.pdf; Created by: Karrer Zheng; Created Date: 6/8/2015; Capacitance: 6.8 μF; Application: Medium and high voltage type range from 160V-450V used as primary side input filter in power supply; Low voltage type used as energy storage or low frequency filtering in circuit, applied to general switching power supply, AC-DC converter, adapter, charger, TV, VCR, DC motor circuit filter, digital audio, digital cameras, digital video cameras, satellite receiver etc.
footprint WCAP-ATG5 5x11x2x0.5
pins: 1, 2

## WCAP-ATG5 5x11x2x0.5 860020772010
designator C?, comment 10 μF
WCAP-ATG5 Aluminum Electrolytic Capacitors , 10 μF; + / - 20%; 63 V , 5 x 11; Manufacturer: Wurth Elektronik; partNo: 860020772010; E-mail: libraries@we-online.com; Characteristics: Aluminum Electrolytic Capacitor; Recommended soldering: Wave; Operating temperature:–40 °C to +105 °C for UR < 400 V; –25 °C to +105 °C for UR ≥ 400 V; General purpose product series with max. temperature of +105 °C; Load life: 2000 h @ +105 °C; ComponentLink1Description: Manufacturer; ComponentLink1URL: http://www.we-online.com; ComponentLink2Description: Datasheet; ComponentLink2URL: http://katalog.we-online.de/pbs/datasheet/860020772010.pdf; Created by: Karrer Zheng; Created Date: 6/8/2015; Capacitance: 10 μF; Application: Medium and high voltage type range from 160V-450V used as primary side input filter in power supply; Low voltage type used as energy storage or low frequency filtering in circuit, applied to general switching power supply, AC-DC converter, adapter, charger, TV, VCR, DC motor circuit filter, digital audio, digital cameras, digital video cameras, satellite receiver etc.
footprint WCAP-ATG5 5x11x2x0.5
pins: 1, 2

## WCAP-ATG5 6.3x11x2.5x0.5 860020773011
designator C?, comment 22 μF
WCAP-ATG5 Aluminum Electrolytic Capacitors , 22 μF; + / - 20%; 63 V , 6,3 x 11; Manufacturer: Wurth Elektronik; partNo: 860020773011; E-mail: libraries@we-online.com; Characteristics: Aluminum Electrolytic Capacitor; Recommended soldering: Wave; Operating temperature:–40 °C to +105 °C for UR < 400 V; –25 °C to +105 °C for UR ≥ 400 V; General purpose product series with max. temperature of +105 °C; Load life: 2000 h @ +105 °C; ComponentLink1Description: Manufacturer; ComponentLink1URL: http://www.we-online.com; ComponentLink2Description: Datasheet; ComponentLink2URL: http://katalog.we-online.de/pbs/datasheet/860020773011.pdf; Created by: Karrer Zheng; Created Date: 6/8/2015; Capacitance: 22 μF; Application: Medium and high voltage type range from 160V-450V used as primary side input filter in power supply; Low voltage type used as energy storage or low frequency filtering in circuit, applied to general switching power supply, AC-DC converter, adapter, charger, TV, VCR, DC motor circuit filter, digital audio, digital cameras, digital video cameras, satellite receiver etc.
footprint WCAP-ATG5 6.3x11x2.5x0.5
pins: 1, 2

## WCAP-ATG5 6.3x11x2.5x0.5 860020773012
designator C?, comment 33 μF
WCAP-ATG5 Aluminum Electrolytic Capacitors , 33 μF; + / - 20%; 63 V , 6,3 x 11; Manufacturer: Wurth Elektronik; partNo: 860020773012; E-mail: libraries@we-online.com; Characteristics: Aluminum Electrolytic Capacitor; Recommended soldering: Wave; Operating temperature:–40 °C to +105 °C for UR < 400 V; –25 °C to +105 °C for UR ≥ 400 V; General purpose product series with max. temperature of +105 °C; Load life: 2000 h @ +105 °C; ComponentLink1Description: Manufacturer; ComponentLink1URL: http://www.we-online.com; ComponentLink2Description: Datasheet; ComponentLink2URL: http://katalog.we-online.de/pbs/datasheet/860020773012.pdf; Created by: Karrer Zheng; Created Date: 6/8/2015; Capacitance: 33 μF; Application: Medium and high voltage type range from 160V-450V used as primary side input filter in power supply; Low voltage type used as energy storage or low frequency filtering in circuit, applied to general switching power supply, AC-DC converter, adapter, charger, TV, VCR, DC motor circuit filter, digital audio, digital cameras, digital video cameras, satellite receiver etc.
footprint WCAP-ATG5 6.3x11x2.5x0.5
pins: 1, 2

## WCAP-ATG5 6.3x11x2.5x0.5 860020773013
designator C?, comment 47 μF
WCAP-ATG5 Aluminum Electrolytic Capacitors , 47 μF; + / - 20%; 63 V , 6,3 x 11; Manufacturer: Wurth Elektronik; partNo: 860020773013; E-mail: libraries@we-online.com; Characteristics: Aluminum Electrolytic Capacitor; Recommended soldering: Wave; Operating temperature:–40 °C to +105 °C for UR < 400 V; –25 °C to +105 °C for UR ≥ 400 V; General purpose product series with max. temperature of +105 °C; Load life: 2000 h @ +105 °C; ComponentLink1Description: Manufacturer; ComponentLink1URL: http://www.we-online.com; ComponentLink2Description: Datasheet; ComponentLink2URL: http://katalog.we-online.de/pbs/datasheet/860020773013.pdf; Created by: Karrer Zheng; Created Date: 6/8/2015; Capacitance: 47 μF; Application: Medium and high voltage type range from 160V-450V used as primary side input filter in power supply; Low voltage type used as energy storage or low frequency filtering in circuit, applied to general switching power supply, AC-DC converter, adapter, charger, TV, VCR, DC motor circuit filter, digital audio, digital cameras, digital video cameras, satellite receiver etc.
footprint WCAP-ATG5 6.3x11x2.5x0.5
pins: 1, 2

## WCAP-ATG5 8x11.5x3.5x0.5 860020774014
designator C?, comment 68 μF
WCAP-ATG5 Aluminum Electrolytic Capacitors , 68 μF; + / - 20%; 63 V , 8 x 11,5; Manufacturer: Wurth Elektronik; partNo: 860020774014; E-mail: libraries@we-online.com; Characteristics: Aluminum Electrolytic Capacitor; Recommended soldering: Wave; Operating temperature:–40 °C to +105 °C for UR < 400 V; –25 °C to +105 °C for UR ≥ 400 V; General purpose product series with max. temperature of +105 °C; Load life: 2000 h @ +105 °C; ComponentLink1Description: Manufacturer; ComponentLink1URL: http://www.we-online.com; ComponentLink2Description: Datasheet; ComponentLink2URL: http://katalog.we-online.de/pbs/datasheet/860020774014.pdf; Created by: Karrer Zheng; Created Date: 6/8/2015; Capacitance: 68 μF; Application: Medium and high voltage type range from 160V-450V used as primary side input filter in power supply; Low voltage type used as energy storage or low frequency filtering in circuit, applied to general switching power supply, AC-DC converter, adapter, charger, TV, VCR, DC motor circuit filter, digital audio, digital cameras, digital video cameras, satellite receiver etc.
footprint WCAP-ATG5 8x11.5x3.5x0.5
pins: 1, 2
